# Altium footprint library LimeMicroAltiumLib_pcbLib.PcbLib: 223 footprints (part 8 of 15)
Each footprint in its own frame and in the unit in brackets; x right, y up, seen from the top. Pads: shape width x height; smd on the part's side, far side on the other; paste and mask are expansions set on the pad; w line width, h text height; cw(c..) or ccw(c..) is an arc to the next point about the centre after c.
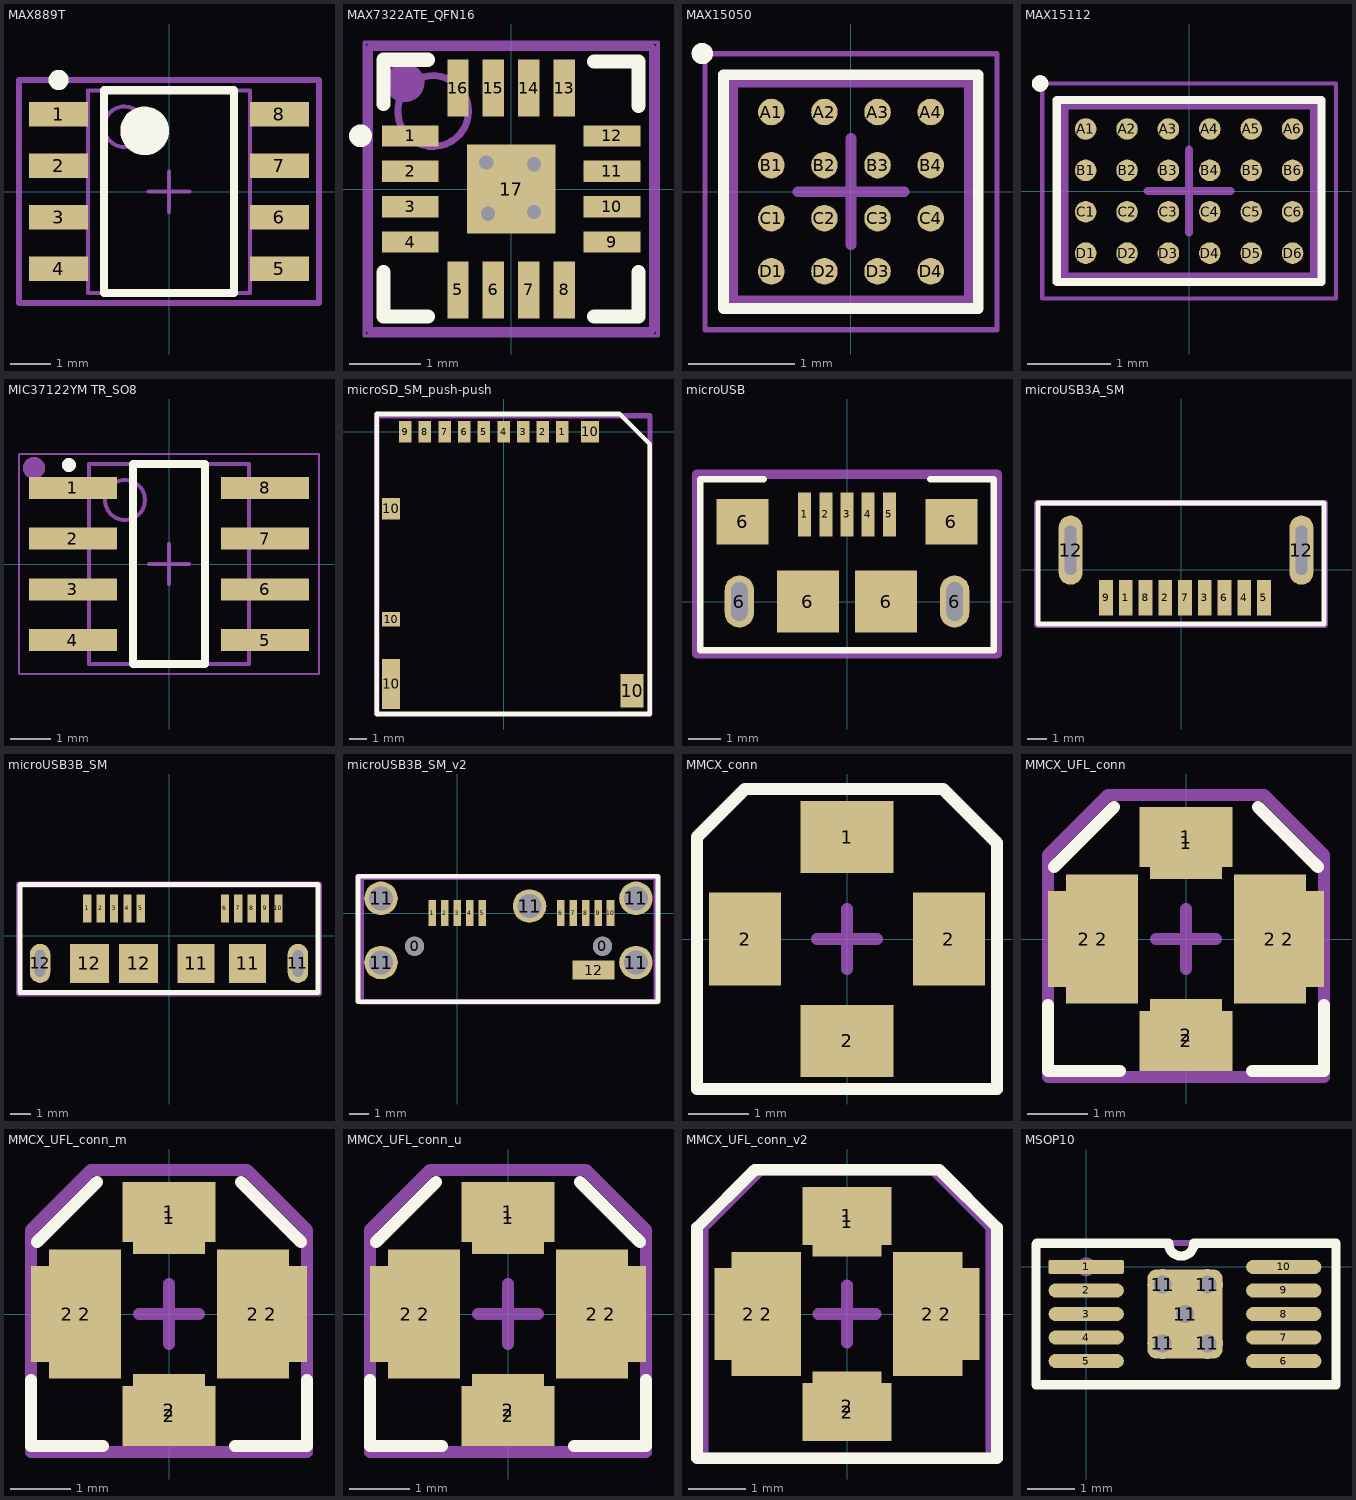
[diagram p7: the footprints below, top view; thin cyan lines are the x and y axes]

## MAX889T [mm] "SOIC, 8-Leads, Body 4,90x3,90mm, Pitch 1,27mm, IPC Medium Density"
height 1.75
pads (8):
  rect 1.45x0.6 smd: 1(-2.725,1.905) 2(-2.725,0.635) 3(-2.725,-0.635) 4(-2.725,-1.905) 5(2.725,-1.905) 6(2.725,-0.635) 7(2.725,0.635) 8(2.725,1.905)
Top Overlay:
  circle w0.6: c-0.6,1.5 r0.3
  circle w0.25: c-2.725,2.755 r0.125
  lines w0.2: -1.6,-2.5 1.6,-2.5 1.6,2.5 -1.6,2.5 -1.6,-2.5
Mechanical 13:
  circle w0.1: c-1.1,1.6 r0.5
  lines w0.1: -2,-2.5 2,-2.5 2,2.5 -2,2.5 -2,-2.5
Mechanical 15:
  circle w0.25: c-2.725,1.905 r0.125
  lines w0.1: -0.5,0 0.5,0 ; 0,-0.5 0,0.5
  lines w0.15: -3.7,-2.75 3.7,-2.75 3.7,2.75 -3.7,2.75 -3.7,-2.75
  text ".Designator" at -0.05,0 h0.7
3D body "SOIC-8.STEP": height 1.75, standoff 0, extent -3,-2.45 3,2.45

## MAX7322ATE_QFN16 [mm]
height 0.8
pads (17):
  rect 0.8x0.3 smd mask+0.05: 1(-1.425,0.75) 2(-1.425,0.25) 3(-1.425,-0.25) 4(-1.425,-0.75) 9(1.425,-0.75) 10(1.425,-0.25) 11(1.425,0.25) 12(1.425,0.75)
  rect 0.3x0.8 smd mask+0.05: 5(-0.75,-1.425) 6(-0.25,-1.425) 7(0.25,-1.425) 8(0.75,-1.425) 13(0.75,1.425) 14(0.25,1.425) 15(-0.25,1.425) 16(-0.75,1.425)
  rect 1.25x1.25 smd mask+0.05: 17(0,0)
via -0.35,0.375 diameter 0.4 hole 0.2
via 0.325,0.35 diameter 0.4 hole 0.2
via 0.325,-0.325 diameter 0.4 hole 0.2
via -0.325,-0.35 diameter 0.4 hole 0.2
Top Overlay:
  circle w0.25: c-2.125,0.75 r0.035
  lines w0.2: -1.8,-1.175 -1.8,-1.8 -1.175,-1.8 ; -1.8,1.2 -1.8,1.825 -1.175,1.825 ; 1.175,-1.8 1.8,-1.8 1.8,-1.175 ; 1.175,1.8 1.8,1.8 1.8,1.175
Mechanical 13:
  circle w0.1: c-1.1,1.1 r0.5
  lines w0.1: -2,-2 2,-2 2,2 -2,2 -2,-2
Mechanical 15:
  circle w0.35: c-1.5,1.5 r0.1
  lines w0.05: -2.075,-2.075 2.075,-2.075 2.075,2.075 -2.075,2.075 -2.075,-2.075
  lines w0.1: -0.5,0 0.5,0 ; 0,-0.5 0,0.5
  text ".Designator" at 0,0 h0.7
3D body "User Library-qfn16-3x3.step": height 0.92, standoff 0, extent -1.5,-1.5 1.5,1.5

## MAX15050 [mm] "BGA, 16-Leads, Body 2,22x2,06mmx0,25mm, Pitch 0,50mm"
height 0.25
pads (16):
  round 0.25 smd: A1(-0.75,0.75) A2(-0.25,0.75) A3(0.25,0.75) A4(0.75,0.75) B1(-0.75,0.25) B2(-0.25,0.25) B3(0.25,0.25) B4(0.75,0.25) C1(-0.75,-0.25) C2(-0.25,-0.25) C3(0.25,-0.25) C4(0.75,-0.25) D1(-0.75,-0.75) D2(-0.25,-0.75) D3(0.25,-0.75) D4(0.75,-0.75)
Top Overlay:
  circle w0.1: c-1.4,1.3 r0.05
  lines w0.1: -1.2,-1.1 -1.2,1.1 1.2,1.1 1.2,-1.1 -1.2,-1.1
Mechanical 13:
  lines w0.1: -1.115,-1.03 -1.115,1.03 1.115,1.03 1.115,-1.03 -1.115,-1.03
Mechanical 15:
  lines w0.05: -1.375,-1.3 -1.375,1.3 1.375,1.3 1.375,-1.3 -1.375,-1.3
  lines w0.1: -0.5,0 0.5,0 ; 0,-0.5 0,0.5
  text ".Designator" at 0,0 h0.7
3D body: height 0.25, standoff 0.25, extent -1.115,-1.03 1.115,1.03

## MAX15112 [mm] "BGA, 24-Leads, Body 3,02x2,07mmx0,25mm, Pitch 0,50mm"
height 0.25
pads (24):
  round 0.26 smd: A1(-1.25,0.75) A2(-0.75,0.75) A3(-0.25,0.75) A4(0.25,0.75) A5(0.75,0.75) A6(1.25,0.75) B1(-1.25,0.25) B2(-0.75,0.25) B3(-0.25,0.25) B4(0.25,0.25) B5(0.75,0.25) B6(1.25,0.25) C1(-1.25,-0.25) C2(-0.75,-0.25) C3(-0.25,-0.25) C4(0.25,-0.25) C5(0.75,-0.25) C6(1.25,-0.25) D1(-1.25,-0.75) D2(-0.75,-0.75) D3(-0.25,-0.75) D4(0.25,-0.75) D5(0.75,-0.75) D6(1.25,-0.75)
Top Overlay:
  circle w0.1: c-1.8,1.3 r0.05
  lines w0.1: -1.6,-1.1 -1.6,1.1 1.6,1.1 1.6,-1.1 -1.6,-1.1
Mechanical 13:
  lines w0.1: -1.51,-1.035 -1.51,1.035 1.51,1.035 1.51,-1.035 -1.51,-1.035
Mechanical 15:
  lines w0.05: -1.775,-1.3 -1.775,1.3 1.775,1.3 1.775,-1.3 -1.775,-1.3
  lines w0.1: -0.5,0 0.5,0 ; 0,-0.5 0,0.5
  text ".Designator" at 0,0 h0.7
3D body: height 0.25, standoff 0.25, extent -1.51,-1.035 1.51,1.035

## MIC37122YM TR_SO8 [mm] "SOIC, 8-Leads, Body 4,90x3,90mm, Pitch 1,27mm, IPC Medium Density"
height 1.7
pads (8):
  rect 2.2x0.55 smd: 1(-2.4,1.905) 2(-2.4,0.635) 3(-2.4,-0.635) 4(-2.4,-1.905) 5(2.4,-1.905) 6(2.4,-0.635) 7(2.4,0.635) 8(2.4,1.905)
Top Overlay:
  circle w0.25: c-2.5,2.475 r0.05
  lines w0.2: -0.9,-2.5 0.9,-2.5 0.9,2.5 -0.9,2.5 -0.9,-2.5
Mechanical 13:
  circle w0.1: c-1.1,1.6 r0.5
  lines w0.1: -2,-2.5 2,-2.5 2,2.5 -2,2.5 -2,-2.5
Mechanical 15:
  circle w0.35: c-3.375,2.4 r0.1
  lines w0.05: -3.75,-2.75 3.75,-2.75 3.75,2.75 -3.75,2.75 -3.75,-2.75
  lines w0.1: -0.5,0 0.5,0 ; 0,-0.5 0,0.5
  text ".Designator" at 0,0 h0.7
3D body "CircuitWorks-SO-8.step": height 1.45, standoff 0, extent -2.889,-2.45 2.889,2.452

## microSD_SM_push-push [mm]
pads (14):
  rect 0.7x1.2 smd: 1(3.3,0) 2(2.2,0) 3(1.1,0) 4(0,0) 5(-1.1,0) 6(-2.2,0) 7(-3.3,0) 8(-4.4,0) 9(-5.5,0)
  rect 1x2.8 smd: 10(-6.3,-14.11)
  rect 1x0.8 smd: 10(-6.3,-10.5)
  rect 1x1.2 smd: 10(-6.3,-4.3) 10(4.85,0)
  rect 1.3x1.9 smd: 10(7.2,-14.5)
Top Overlay:
  lines w0.254: -7.1,-15.8 8.2,-15.8 8.2,-0.7 6.5,1 -7.1,1 -7.1,-15.8
Mechanical 15:
  lines w0.3: -7.1,-15.8 -7.1,1 -7,0.9 8.2,0.9 8.2,-15.8
  text ".Designator" at 0.4,-8.1 h0.7

## microUSB [mm]
pads (11):
  rect 0.4x1.35 smd: 1(-1.3,2.675) 2(-0.65,2.675) 3(0,2.675) 4(0.65,2.675) 5(1.3,2.675)
  oval 0.9x1.6 hole 0.5 slot 1.2 at 90 deg: 6(-3.3,0) 6(3.3,0)
  rect 1.6x1.4 smd: 6(-3.2,2.45) 6(3.2,2.45)
  rect 1.9x1.9 smd: 6(-1.2,0) 6(1.2,0)
Top Overlay:
  lines w0.2: -2.55,3.75 -4.5,3.75 -4.5,-1.5 4.5,-1.5 4.5,3.75 2.55,3.75
Mechanical 15:
  lines w0.3: -4.6,-1.6 4.6,-1.6 4.6,3.9 -4.6,3.9 -4.6,-1.6
  text ".Designator" at 0,1.3 h0.7
3D body "USB3090-30-A_revE.step": height 2.59, standoff -1, extent -3.891,-2.565 3.892,2.925

## microUSB3A_SM [mm]
pads (11):
  rect 0.7x1.8 smd: 1(-2.8,-1.4) 2(-0.8,-1.4) 3(1.2,-1.4) 4(3.2,-1.4) 5(4.2,-1.4) 6(2.2,-1.4) 7(0.2,-1.4) 8(-1.8,-1.4) 9(-3.8,-1.4)
  oval 1.2x3.5 hole 0.6 slot 2.5 at 90 deg: 12(-5.6,1) 12(6.1,1)
Top Overlay:
  lines w0.254: -7.25,-2.75 -7.25,3.4 7.25,3.4 7.25,-2.75 -7.25,-2.75
Mechanical 15:
  lines w0.3: -7.3,-2.8 -7.3,3.4 7.3,3.4 7.3,-2.8 -7.3,-2.8
  text ".Designator" at 0,0.1 h0.7
3D body "692112030100.stp": height 1.8, standoff -2.7, extent -5.8,-1.954 6.2,18.8

## microUSB3B_SM [mm]
pads (16):
  rect 0.4x1.35 smd: 1(-3.975,1.338) 2(-3.325,1.338) 3(-2.675,1.338) 4(-2.025,1.338) 5(-1.375,1.338) 6(2.725,1.338) 7(3.375,1.338) 8(4.025,1.338) 9(4.675,1.338) 10(5.325,1.338)
  rect 1.8x1.9 smd: 11(1.325,-1.338) 11(3.825,-1.338)
  oval 1x1.9 hole 0.5 slot 1.3 at 90 deg: 11(6.275,-1.338) 12(-6.275,-1.338)
  rect 1.9x1.9 smd: 12(-3.875,-1.338) 12(-1.475,-1.338)
Top Overlay:
  lines w0.254: -7.25,-2.75 -7.25,2.5 7.25,2.5 7.25,-2.75 -7.25,-2.75
Mechanical 15:
  lines w0.3: -7.3,-2.8 -7.3,2.5 7.3,2.5 7.3,-2.8 -7.3,-2.8
  text ".Designator" at 0,0.1 h0.7
3D body "USB3110-30-A_revF.step": height 2.73, standoff -1, extent -6.707,-4.118 6.707,1.8

## microUSB3B_SM_v2 [mm] "GSB443T33HRCT-ND"
pads (18):
  round 1 hole 1: 0(-2.225,-1.73) 0(7.575,-1.73)
  rect 0.4x1.35 smd: 1(-1.3,0) 2(-0.65,0) 3(0,0) 4(0.65,0) 5(1.3,0) 6(5.4,0) 7(6.05,0) 8(6.7,0) 9(7.35,0) 10(8,0)
  round 1.75 hole 1.25: 11(-3.975,-2.58) 11(-3.975,0.77) 11(3.775,0.37) 11(9.325,-2.58) 11(9.325,0.77)
  rect 2.18x0.98 smd: 12(7.115,-2.97)
Top Overlay:
  lines w0.254: -5.175,-4.625 10.475,-4.625 10.475,1.925 -5.175,1.925 -5.175,-4.625
Mechanical 15:
  lines w0.3: -5.025,-4.625 10.4,-4.625 10.4,1.875 -5.025,1.875 -5.025,-4.625
  text ".Designator" at 2.675,-1.238 h0.7
3D body: height 4, standoff 0, extent -4.032,-4.625 9.382,-0.607
3D body "USB3110-30-A_revF.step": height 5.73, standoff 2, extent -4.032,-6.525 9.382,-0.607

## MMCX_conn [mm]
pads (4):
  rect 1.55x1.2 smd: 1(0,1.7) 2(0,-1.7)
  rect 1.2x1.55 smd: 2(-1.7,0) 2(1.7,0)
Top Overlay:
  lines w0.2: -2.5,-2.5 -2.5,1.7 -1.7,2.5 1.6,2.5 2.5,1.6 2.5,-2.5 -2.5,-2.5
Mechanical 15:
  lines w0.2: -0.5,0 0.5,0 ; 0,-0.5 0,0.5 ; -2.5,-2.5 2.5,-2.5 2.5,1.6 1.6,2.5 -1.7,2.5 -2.5,1.7 -2.5,-2.5
  text "in" at -0.7,1.3 h0.9
  text ".designator" at 0,0 h0.9
3D body "User Library-Molex_MMCX_734152061.step": height 5, standoff 0, extent -2.475,-2.475 2.475,2.475

## MMCX_UFL_conn [mm]
pads (8):
  rect 1.2x1.2 smd mask+0.05: 1(0,1.6) 2(0,-1.6)
  rect 1.55x1 smd mask+0.05: 1(0,1.7) 2(0,-1.7)
  rect 1.2x1.6 smd mask+0.05: 2(-1.7,0) 2(1.7,0)
  rect 1.2x2.15 smd mask+0.05: 2(-1.4,0) 2(1.4,0)
Top Overlay:
  lines w0.2: -2.3,-1.1 -2.3,-2.2 -1.1,-2.2 ; -2.2,1.2 -1.2,2.2 ; 1.1,-2.2 2.3,-2.2 2.3,-1.1 ; 1.2,2.2 2.2,1.2
Mechanical 15:
  lines w0.2: -0.5,0 0.5,0 ; 0,-0.5 0,0.5 ; -2.3,-2.3 -2.3,1.4 -1.3,2.4 1.3,2.4 2.3,1.4 2.3,-2.3 -2.3,-2.3
  text ".designator" at 0,0 h0.9
  text "in" at -0.7,1.3 h0.9
3D body "User Library-Molex_MMCX_734152061.step": height 5, standoff 0, extent -2.475,-2.475 2.475,2.475
3D body "User Library-U_FL-R-SMT-1.step": height 1.25, standoff -0.01, extent -1.5,-1.55 1.5,1.55

## MMCX_UFL_conn_m [mm]
pads (8):
  rect 1.2x1.2 smd mask+0.05: 1(0,1.6) 2(0,-1.6)
  rect 1.55x1 smd mask+0.05: 1(0,1.7) 2(0,-1.7)
  rect 1.2x1.6 smd mask+0.05: 2(-1.7,0) 2(1.7,0)
  rect 1.2x2.15 smd mask+0.05: 2(-1.4,0) 2(1.4,0)
Top Overlay:
  lines w0.2: -2.3,-1.1 -2.3,-2.2 -1.1,-2.2 ; -2.2,1.2 -1.2,2.2 ; 1.1,-2.2 2.3,-2.2 2.3,-1.1 ; 1.2,2.2 2.2,1.2
Mechanical 15:
  lines w0.2: -0.5,0 0.5,0 ; 0,-0.5 0,0.5 ; -2.3,-2.3 -2.3,1.4 -1.3,2.4 1.3,2.4 2.3,1.4 2.3,-2.3 -2.3,-2.3
  text ".designator" at 0,0 h0.9
  text "in" at -0.7,1.3 h0.9
3D body "User Library-Molex_MMCX_734152061.step": height 5, standoff 0, extent -2.475,-2.475 2.475,2.475

## MMCX_UFL_conn_u [mm]
pads (8):
  rect 1.2x1.2 smd mask+0.05: 1(0,1.6) 2(0,-1.6)
  rect 1.55x1 smd mask+0.05: 1(0,1.7) 2(0,-1.7)
  rect 1.2x1.6 smd mask+0.05: 2(-1.7,0) 2(1.7,0)
  rect 1.2x2.15 smd mask+0.05: 2(-1.4,0) 2(1.4,0)
Top Overlay:
  lines w0.2: -2.3,-1.1 -2.3,-2.2 -1.1,-2.2 ; -2.2,1.2 -1.2,2.2 ; 1.1,-2.2 2.3,-2.2 2.3,-1.1 ; 1.2,2.2 2.2,1.2
Mechanical 15:
  lines w0.2: -0.5,0 0.5,0 ; 0,-0.5 0,0.5 ; -2.3,-2.3 -2.3,1.4 -1.3,2.4 1.3,2.4 2.3,1.4 2.3,-2.3 -2.3,-2.3
  text ".designator" at 0,0 h0.9
  text "in" at -0.7,1.3 h0.9
3D body "User Library-U_FL-R-SMT-1.step": height 1.25, standoff -0.01, extent -1.5,-1.55 1.5,1.55

## MMCX_UFL_conn_v2 [mm]
pads (8):
  rect 1.2x1.2 smd mask+0.05: 1(0,1.6) 2(0,-1.6)
  rect 1.55x1 smd mask+0.05: 1(0,1.7) 2(0,-1.7)
  rect 1.2x1.6 smd mask+0.05: 2(-1.7,0) 2(1.7,0)
  rect 1.2x2.15 smd mask+0.05: 2(-1.4,0) 2(1.4,0)
Top Overlay:
  lines w0.2: -2.6,-2.5 -2.6,1.5 -1.6,2.5 1.6,2.5 2.6,1.5 2.6,-2.5 -2.6,-2.5
Mechanical 15:
  lines w0.2: -0.5,0 0.5,0 ; 0,-0.5 0,0.5 ; -2.5,-2.5 2.5,-2.5 2.5,1.5 1.5,2.5 -1.5,2.5 -2.5,1.5 -2.5,-2.5
  text "in" at -0.7,1.3 h0.9
  text ".designator" at 0,0 h0.9
3D body "User Library-Molex_MMCX_734152061.step": height 5, standoff 0, extent -2.475,-2.475 2.475,2.475
3D body "User Library-U_FL-R-SMT-1.step": height 1.25, standoff -0.01, extent -1.5,-1.55 1.5,1.55

## MSOP10 [mm]
pads (16):
  rrect25% 1.6x0.3 smd mask+0.05: 1(0,0)
  oval 1.6x0.3 smd mask+0.05: 2(0,-0.5) 3(0,-1) 4(0,-1.5) 5(0,-2) 6(4.2,-2) 7(4.2,-1.5) 8(4.2,-1) 9(4.2,-0.5) 10(4.2,0)
  round 0.66 hole 0.381: 11(1.625,-1.625) 11(1.625,-0.375) 11(2.1,-1) 11(2.575,-1.625) 11(2.575,-0.375)
  rrect25% 1.6x1.9 smd: 11(2.1,-1)
Top Overlay:
  lines w0.2: 1.725,0.5 -1.049,0.5 -1.067,0.483 -1.067,-2.5 5.309,-2.5 5.309,0.5 2.3,0.5 ; 1.75,0.5 ccw(c2.019,0.5) 2.289,0.5
Top Solder:
  rectangle: 1.175,-2.075 3.025,0.075
Mechanical 15:
  circle w0.2: c0,0 r0.1
  lines w0.127: -1.067,-2.489 5.309,-2.489 5.309,0.508 -1.067,0.508 -1.067,-2.489
  text ".Designator" at 2.1,-1 h0.55
3D body "User Library-MSOP10-1.step": height 1.09, standoff 0, extent -0.475,-2.6 4.675,0.6